# Altium footprint library Semicon-Discrete.pcblib: 205 footprints (part 12 of 13)
Each footprint in its own frame and in the unit in brackets; x right, y up, seen from the top. Pads: shape width x height; smd on the part's side, far side on the other; paste and mask are expansions set on the pad; w line width, h text height; cw(c..) or ccw(c..) is an arc to the next point about the centre after c.
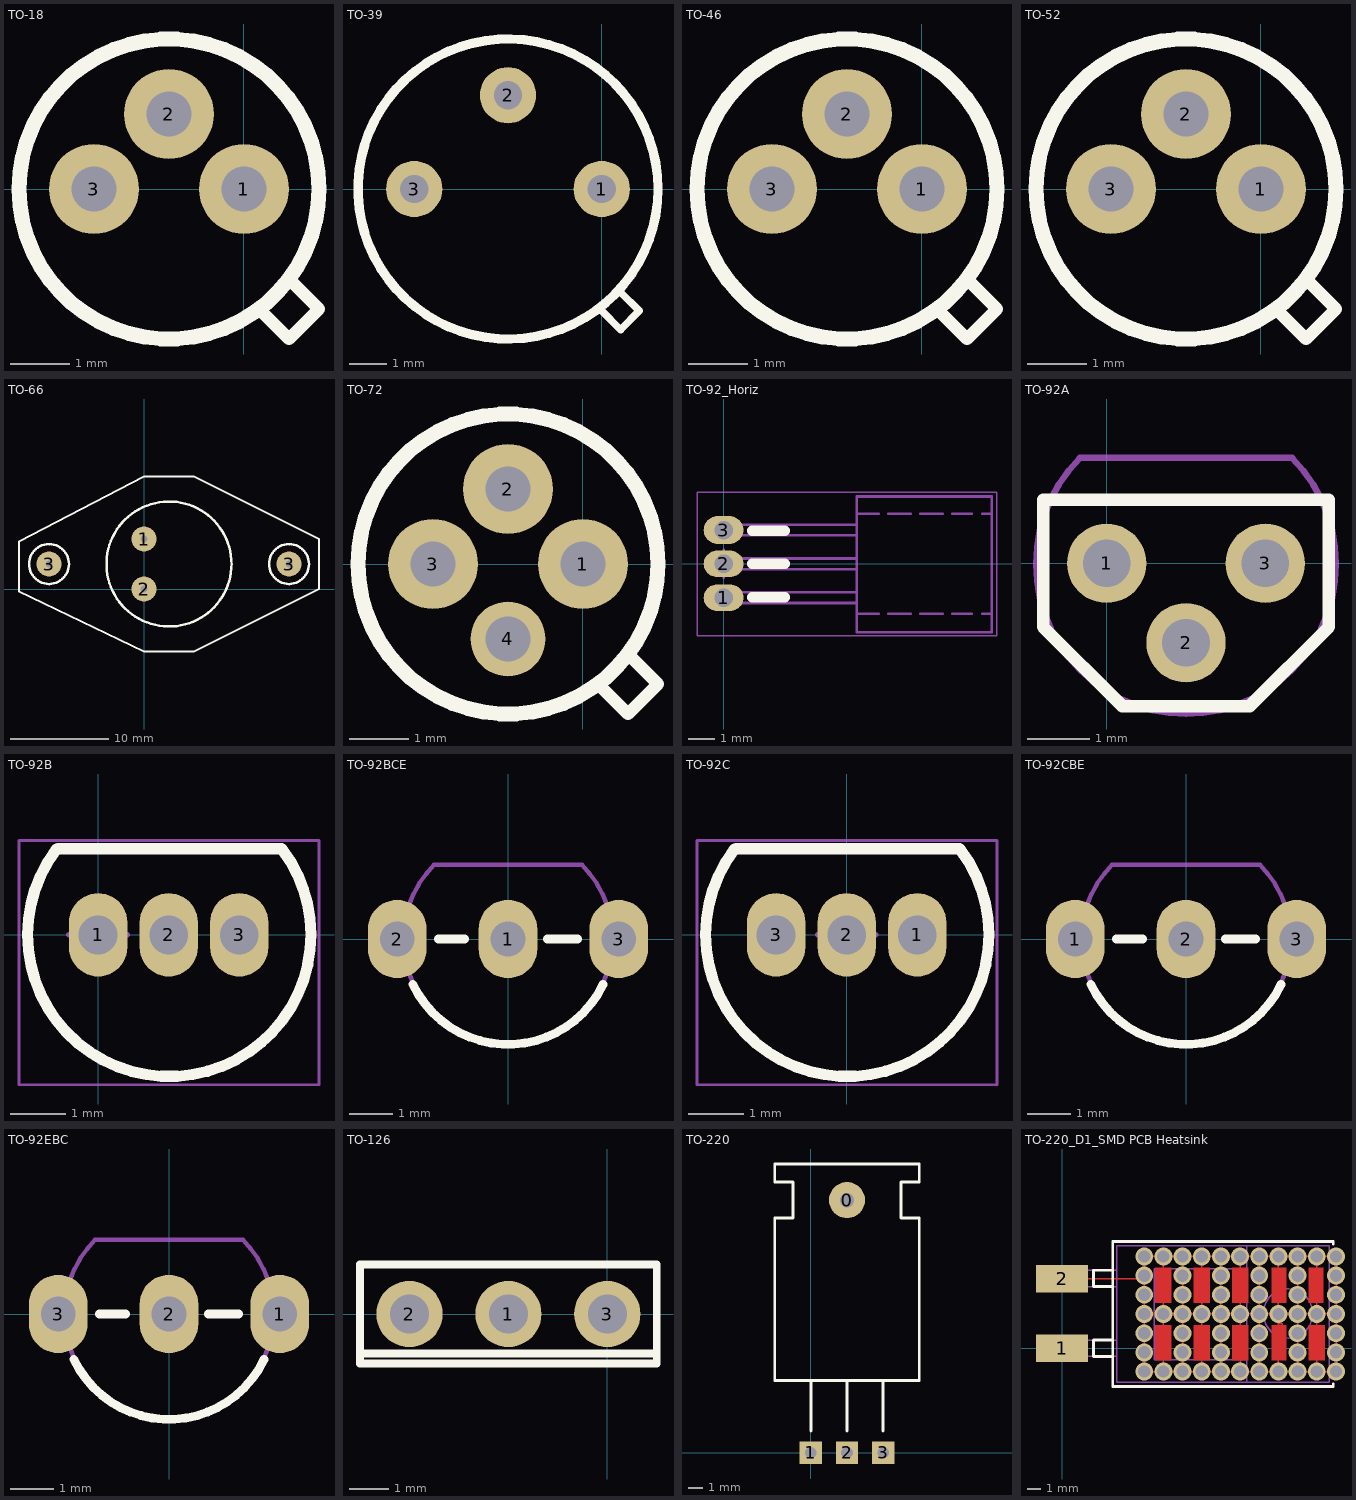
[diagram p11: the footprints below, top view; thin cyan lines are the x and y axes]

## TO-18 [mil]
pads (3):
  round 60 hole 30: 1(0,0) 2(-50,50) 3(-100,0)
TopOverlay:
  circle w10: c-50,0 r100
  lines w8: 10,-80 30,-100 50,-80 30,-60
4-TopCourty:
  lines w3.94: -20.67,0 20.67,0 ; 0,-20.67 0,20.67
7-TopAssy:
  text ".Designator" at -110.24,-34.45 h86.61

## TO-39 [mil]
pads (3):
  round 60 hole 30: 1(0,0) 2(-100,100) 3(-200,0)
TopOverlay:
  circle w10: c-100,0 r160
  lines w8: 0,-130 20,-150 40,-130 20,-110
4-TopCourty:
  lines w3.94: -20.67,0 20.67,0 ; 0,-20.67 0,20.67
7-TopAssy:
  text ".Designator" at -187.99,-69.88 h86.61

## TO-46 [mil]
pads (3):
  round 60 hole 30: 1(0,0) 2(-50,50) 3(-100,0)
TopOverlay:
  circle w10: c-50,0 r100
  lines w8: 10,-80 30,-100 50,-80 30,-60
4-TopCourty:
  lines w3.94: -20.67,0 20.67,0 ; 0,-20.67 0,20.67
7-TopAssy:
  text ".Designator" at -97.44,-71.85 h86.61

## TO-52 [mil]
pads (3):
  round 60 hole 30: 1(0,0) 2(-50,50) 3(-100,0)
TopOverlay:
  circle w10: c-50,0 r100
  lines w8: 10,-80 30,-100 50,-80 30,-60
4-TopCourty:
  lines w3.94: -20.67,0 20.67,0 ; 0,-20.67 0,20.67
7-TopAssy:
  text ".Designator" at -116.14,-61.02 h86.61

## TO-66 [mil]
pads (4):
  round 100 hole 28: 1(0,200) 2(0,0) 3(-380,100) 3(580,100)
TopOverlay:
  circle w10: c580,100 r80
  circle w10: c-380,100 r80
  circle w10: c100,100 r250
  lines w7.87: -500,-10 0,-250 200,-250 700,0 700,200 200,450 0,450 -500,190 -500,-10
4-TopCourty:
  lines w3.94: -20.67,0 20.67,0 ; 0,-20.67 0,20.67
7-TopAssy:
  text ".Designator" at -68.9,82.68 h86.61

## TO-72 [mil]
pads (4):
  round 60 hole 30: 1(0,0) 2(-50,50) 3(-100,0)
  round 50 hole 30: 4(-50,-50)
TopOverlay:
  circle w10: c-50,0 r100
  lines w8: 10,-80 30,-100 50,-80 30,-60
4-TopCourty:
  lines w3.94: -20.67,0 20.67,0 ; 0,-20.67 0,20.67
7-TopAssy:
  text ".Designator" at -109.25,-27.56 h86.61

## TO-92_Horiz [mm]
height 4
pads (3):
  oval 1.5x1 hole 0.7: 1(0,-1.27) 2(0,0)
  oval 1.5x1.05 hole 0.7: 3(0,1.27)
TopOverlay:
  lines w0.4: 1.075,-1.25 2.3,-1.25 ; 1.075,0 2.3,0 ; 1.075,1.25 2.3,1.25
2-TopCompOutl:
  lines w0.1: 5,-1.875 5.825,-1.875 ; 5,1.88 5.825,1.88 ; 6.2,-1.875 7.025,-1.875 ; 6.2,1.88 7.025,1.88 ; 7.4,-1.875 8.225,-1.875 ; 7.4,1.88 8.225,1.88 ; 8.6,-1.875 9.325,-1.875 ; 8.6,1.88 9.325,1.88 ; 9.725,-1.875 10.075,-1.875 ; 9.725,1.88 10.075,1.88 ; -0.125,-1.47 5,-1.47 ; -0.125,-1.47 -0.125,-1.07 ; -0.125,-1.47 -0.125,-1.07 ; -0.125,-1.07 5,-1.07 ; -0.1,-0.2 -0.1,0.2 ; -0.1,-0.2 5,-0.2 ; -0.1,-0.2 -0.1,0.2 ; -0.1,0.2 5,0.2 ; -0.1,1.07 5,1.07 ; -0.1,1.07 -0.1,1.47 ; -0.1,1.07 -0.1,1.47 ; -0.1,1.47 5,1.47 ; 5,-1.47 5,-1.07 ; 5,-1.47 5,-1.07 ; 5,-0.2 5,0.2 ; 5,-0.2 5,0.2 ; 5,1.07 5,1.47 ; 5,1.07 5,1.47 ; 5,-2.57 5,2.53 10.075,2.53 10.075,-2.57 5,-2.57
4-TopCourty:
  circle w0.1: c0,0 r0.35
  lines w0.05: -1,-2.705 -1,2.695 10.275,2.695 10.275,-2.705 -1,-2.705
  lines w0.1: -0.525,0 0.525,0 ; 0,-0.525 0,0.525 0,-0.525
7-TopAssy:
  lines w0.1: 5,-1.875 5.825,-1.875 ; 5,1.88 5.825,1.88 ; 6.2,-1.875 7.025,-1.875 ; 6.2,1.88 7.025,1.88 ; 7.4,-1.875 8.225,-1.875 ; 7.4,1.88 8.225,1.88 ; 8.6,-1.875 9.325,-1.875 ; 8.6,1.88 9.325,1.88 ; 9.725,-1.875 10.075,-1.875 ; 9.725,1.88 10.075,1.88 ; -0.125,-1.47 -0.125,-1.07 ; -0.125,-1.47 -0.125,-1.07 ; -0.125,-1.47 5,-1.47 ; -0.125,-1.07 5,-1.07 ; -0.1,-0.2 -0.1,0.2 ; -0.1,-0.2 5,-0.2 ; -0.1,-0.2 -0.1,0.2 ; -0.1,0.2 5,0.2 ; -0.1,1.07 -0.1,1.47 ; -0.1,1.07 -0.1,1.47 ; -0.1,1.07 5,1.07 ; -0.1,1.47 5,1.47 ; 5,-1.47 5,-1.07 ; 5,-1.47 5,-1.07 ; 5,-0.2 5,0.2 ; 5,-0.2 5,0.2 ; 5,1.07 5,1.47 ; 5,1.07 5,1.47 ; 5,-2.57 10.075,-2.57 10.075,2.53 5,2.53 5,-2.57
  text ".Designator" at -2.55,2.25 h2.2
3D body "TO92_Horizontal.STEP": height 2.75, standoff -2.7, extent -0.225,-2.525 9.776,2.532

## TO-92A [mil]
pads (3):
  round 50 hole 30: 1(0,0) 2(50,-50) 3(100,0)
TopOverlay:
  lines w8: -40,-40 -40,40 140,40 140,-40 90,-90 10,-90 -40,-40
4-TopCourty:
  circle w3.94: c0,0 r13.78
  lines w3.94: -20.67,0 20.67,0 ; 0,-20.67 0,20.67
7-TopAssy:
  lines w3.94: -16.93,66.54 116.93,66.54 ; -16.81,66.42 ccw(c50,-0.39) 116.81,66.42
  text ".Designator" at -11.02,-29.92 h86.61

## TO-92B [mm]
pads (3):
  oval 1.05x1.5 hole 0.7: 1(0,0) 2(1.27,0) 3(2.54,0)
TopOverlay:
  lines w0.2: -0.747,1.548 ccw(c1.28,0) 3.303,1.552 ; -0.725,1.55 3.3,1.55
2-TopCompOutl:
  lines w0.1: -0.747,1.548 ccw(c1.28,0) 3.303,1.552 ; -0.725,1.55 3.3,1.55
4-TopCourty:
  circle w0.1: c0,0 r0.35
  lines w0.05: -1.425,-2.7 -1.425,1.7 3.975,1.7 3.975,-2.7 -1.425,-2.7
  lines w0.1: -0.525,0 0.525,0 ; 0,-0.525 0,0.525
7-TopAssy:
  lines w0.1: -0.747,1.548 ccw(c1.28,0) 3.303,1.552 ; -0.725,1.55 3.3,1.55
  text ".Designator" at -0.13,-0.75 h2.2

## TO-92BCE [mm]
pads (3):
  oval 1.35x1.8 hole 0.8: 1(0,0) 2(-2.54,0) 3(2.54,0)
TopOverlay:
  lines w0.2: -2.182,-1.039 ccw(c0,0) 2.18,-1.043 ; -1.6,0 -1,0 ; 0.9,0 1.6,0
2-TopCompOutl:
  lines w0.1: -1.7,1.7 1.7,1.7 ; -1.697,1.697 ccw(c0,0) 1.697,1.697
4-TopCourty:
  circle w0.1: c0,0 r0.35
  lines w0.1: -0.525,0 0.525,0 ; 0,-0.525 0,0.525
7-TopAssy:
  lines w0.1: -1.7,1.7 1.7,1.7 ; -1.697,1.697 ccw(c0,0) 1.697,1.697
  text ".Designator" at -2.1,1.975 h2.2

## TO-92C [mm]
height 6.7
pads (3):
  oval 1.05x1.5 hole 0.7: 1(1.27,0) 2(0,0) 3(-1.27,0)
TopOverlay:
  lines w0.2: -2.017,1.548 ccw(c0.01,0) 2.033,1.552 ; -1.995,1.55 2.03,1.55
2-TopCompOutl:
  lines w0.1: -2.017,1.548 ccw(c0.01,0) 2.033,1.552 ; -1.995,1.55 2.03,1.55
4-TopCourty:
  circle w0.1: c0,0 r0.35
  lines w0.05: -2.695,-2.7 2.705,-2.7 2.705,1.7 -2.695,1.7 -2.695,-2.7
  lines w0.1: -0.525,0 0.525,0 ; 0,-0.525 0,0.525
7-TopAssy:
  lines w0.1: -2.017,1.548 ccw(c0.01,0) 2.033,1.552 ; -1.995,1.55 2.03,1.55
  text ".Designator" at -1.4,-0.75 h2.2
3D body "TO92C.STEP": height 6.7, standoff -2.6, extent -2.525,-2.525 2.532,1.553

## TO-92CBE [mm]
height 5
pads (3):
  oval 1.35x1.8 hole 0.8: 1(-2.54,0) 2(0,0) 3(2.54,0)
TopOverlay:
  lines w0.2: -2.182,-1.039 ccw(c0,0) 2.18,-1.043 ; -1.6,0 -1,0 ; 0.9,0 1.6,0
2-TopCompOutl:
  lines w0.1: -1.7,1.7 1.7,1.7 ; -1.697,1.697 ccw(c0,0) 1.697,1.697
4-TopCourty:
  lines w0.1: -0.525,0 0.525,0 ; 0,-0.525 0,0.525
7-TopAssy:
  lines w0.1: -1.7,1.7 1.7,1.7 ; -1.697,1.697 ccw(c0,0) 1.697,1.697
  text ".Designator" at -1.18,-0.69 h2.2

## TO-92EBC [mm]
pads (3):
  oval 1.35x1.8 hole 0.8: 1(2.54,0) 2(0,0) 3(-2.54,0)
TopOverlay:
  lines w0.2: -2.182,-1.039 ccw(c0,0) 2.18,-1.043 ; -1.6,0 -1,0 ; 0.9,0 1.6,0
2-TopCompOutl:
  lines w0.1: -1.7,1.7 1.7,1.7 ; -1.697,1.697 ccw(c0,0) 1.697,1.697
4-TopCourty:
  circle w0.1: c0,0 r0.35
  lines w0.1: -0.525,0 0.525,0 ; 0,-0.525 0,0.525
7-TopAssy:
  lines w0.1: -1.7,1.7 1.7,1.7 ; -1.697,1.697 ccw(c0,0) 1.697,1.697
  text ".Designator" at -1.41,-0.73 h2.2

## TO-126 [mm]
pads (3):
  round 1.7 hole 1: 1(-2.54,0) 2(-5.08,0) 3(0,0)
TopOverlay:
  lines w0.2: -6.35,-1.016 1.27,-1.016 ; -6.35,-1.27 -6.35,1.27 1.27,1.27 1.27,-1.27 -6.35,-1.27
2-TopCompOutl:
  lines w0.1: -6.4,-1.3 -6.4,1.3 1.3,1.3 1.3,-1.3 -6.4,-1.3
4-TopCourty:
  lines w0.1: -0.525,0 0.525,0 ; 0,-0.525 0,0.525
7-TopAssy:
  text ".Designator" at -5.35,1.575 h2.2

## TO-220 [mil]
pads (4):
  round 100 hole 40: 0(100,700)
  rect 62x62 hole 32: 1(0,0) 2(100,0) 3(200,0)
TopOverlay:
  lines w7.87: 0,60 0,200 ; 100,60 100,200 ; 200,60 200,200 ; -100,200 -100,650 -50,650 -50,750 -100,750 -100,800 300,800 300,750 250,750 250,650 300,650 300,200 -100,200
4-TopCourty:
  lines w3.94: -20.67,0 20.67,0 ; 0,-20.67 0,20.67
7-TopAssy:
  text ".Designator" at 0.98,431.1 h86.61

## TO-220_D1_SMD PCB Heatsink [mm]
height 4.5
pads (2):
  rect 3.8x2 smd: 1(0,0) 2(0,5.075)
via 20,-0.3 diameter 1.3 hole 0.9
via 20,1.1 diameter 1.3 hole 0.9
via 20,-1.7 diameter 1.3 hole 0.9
via 18.6,-1.7 diameter 1.3 hole 0.9
via 15.8,-1.7 diameter 1.3 hole 0.9
via 17.2,-1.7 diameter 1.3 hole 0.9
via 17.2,-0.3 diameter 1.3 hole 0.9
via 17.2,1.1 diameter 1.3 hole 0.9
via 14.4,1.1 diameter 1.3 hole 0.9
via 14.4,-0.3 diameter 1.3 hole 0.9
via 14.4,-1.7 diameter 1.3 hole 0.9
via 13,-1.7 diameter 1.3 hole 0.9
via 11.6,1.1 diameter 1.3 hole 0.9
via 11.6,-0.3 diameter 1.3 hole 0.9
via 11.6,-1.7 diameter 1.3 hole 0.9
via 10.2,-1.7 diameter 1.3 hole 0.9
via 7.4,-1.7 diameter 1.3 hole 0.9
via 8.8,-1.7 diameter 1.3 hole 0.9
via 8.8,-0.3 diameter 1.3 hole 0.9
via 8.8,1.1 diameter 1.3 hole 0.9
via 6,-1.7 diameter 1.3 hole 0.9
via 6,-0.3 diameter 1.3 hole 0.9
via 6,1.1 diameter 1.3 hole 0.9
via 20,5.3 diameter 1.3 hole 0.9
via 20,3.9 diameter 1.3 hole 0.9
via 20,2.5 diameter 1.3 hole 0.9
via 20,6.7 diameter 1.3 hole 0.9
via 18.6,6.7 diameter 1.3 hole 0.9
via 15.8,6.7 diameter 1.3 hole 0.9
via 17.2,6.7 diameter 1.3 hole 0.9
via 17.2,5.3 diameter 1.3 hole 0.9
via 17.2,3.9 diameter 1.3 hole 0.9
via 18.6,2.5 diameter 1.3 hole 0.9
via 17.2,2.5 diameter 1.3 hole 0.9
via 14.4,3.9 diameter 1.3 hole 0.9
via 14.4,5.3 diameter 1.3 hole 0.9
via 14.4,6.7 diameter 1.3 hole 0.9
via 13,6.7 diameter 1.3 hole 0.9
via 11.6,3.9 diameter 1.3 hole 0.9
via 11.6,5.3 diameter 1.3 hole 0.9
via 11.6,6.7 diameter 1.3 hole 0.9
via 10.2,6.7 diameter 1.3 hole 0.9
via 7.4,6.7 diameter 1.3 hole 0.9
via 8.8,6.7 diameter 1.3 hole 0.9
via 8.8,5.3 diameter 1.3 hole 0.9
via 8.8,3.9 diameter 1.3 hole 0.9
via 15.8,2.5 diameter 1.3 hole 0.9
via 14.4,2.5 diameter 1.3 hole 0.9
via 13,2.5 diameter 1.3 hole 0.9
via 11.6,2.5 diameter 1.3 hole 0.9
via 10.2,2.5 diameter 1.3 hole 0.9
via 8.8,2.5 diameter 1.3 hole 0.9
via 7.4,2.5 diameter 1.3 hole 0.9
via 6,6.7 diameter 1.3 hole 0.9
via 6,5.3 diameter 1.3 hole 0.9
via 6,3.9 diameter 1.3 hole 0.9
via 6,2.5 diameter 1.3 hole 0.9
TopLayer:
  region: 19.2,1.7 18,1.7 18,-0.9 19.2,-0.9
  region: 16.4,1.7 15.3,1.7 15.3,-0.9 16.4,-0.9
  region: 13.6,1.7 12.4,1.7 12.4,-0.9 13.6,-0.9
  region: 10.8,1.7 9.6,1.7 9.6,-0.9 10.8,-0.9
  region: 8,1.7 6.8,1.7 6.8,-0.9 8,-0.9
  region: 19.1,5.9 18,5.9 18,3.3 19.1,3.3
  region: 16.4,5.9 15.3,5.9 15.3,3.3 16.4,3.3
  region: 13.6,5.9 12.4,5.9 12.4,3.3 13.6,3.3
  region: 10.8,5.9 9.6,5.9 9.6,3.3 10.8,3.3
  region: 8,5.9 6.8,5.9 6.8,3.3 8,3.3
  lines w0.1: 0,5.075 5.45,5.075 6,5.3 6,6.7 20,6.7 20,-1.7 ; 6,2.5 20,2.5 ; 6,5.5 6,-1.7 ; 7.4,-1.7 7.4,6.7 ; 8.8,-1.7 8.8,6.7 ; 10.2,-1.7 10.2,6.7 ; 11.6,-1.7 11.6,6.7 ; 13,-1.7 13,6.7 ; 14.4,-1.7 14.4,6.7 ; 15.8,-1.7 15.8,6.7 ; 15.8,0.4 16.075,0.4 16.075,1.8 15.8,1.8 ; 15.8,3.25 15.8,3.85 16.175,3.85 16.175,4.6 15.8,4.6 15.8,4.625 ; 17.2,-1.7 17.2,6.7 ; 18.35,4.6 18.6,4.6 18.6,3.2 ; 18.6,-1.7 18.6,6.7 ; 18.6,0.4 18.6,1.8 ; 6,-1.7 20,-1.7 ; 6,-1.7 20,-1.7 ; 7.4,6.7 7.4,6.7 ; 7.4,6.7 7.4,6.7 ; 8.8,6.7 8.8,6.7 ; 11.6,6.7 11.6,6.7 ; 11.6,6.7 11.6,6.7 ; 13,6.7 13,6.7 ; 13,6.7 13,6.7 ; 14.4,6.7 14.4,6.7 ; 14.4,6.7 14.4,6.7
TopOverlay:
  lines w0.2: 3.7,-0.6 2.3,-0.6 2.3,0.6 3.7,0.6 ; 3.7,4.5 2.3,4.5 2.3,5.7 3.7,5.7 ; 19.8,-2.6 19.8,-2.8 3.7,-2.8 3.7,-0.9 3.7,5.9 3.7,7.8 19.8,7.8 19.8,7.6
TopPaste:
  region: 8,5.9 6.8,5.9 6.8,3.3 8,3.3
  region: 10.8,5.9 9.6,5.9 9.6,3.3 10.8,3.3
  region: 13.6,5.9 12.4,5.9 12.4,3.3 13.6,3.3
  region: 16.4,5.9 15.3,5.9 15.3,3.3 16.4,3.3
  region: 19.1,5.9 18,5.9 18,3.3 19.1,3.3
  region: 8,1.7 6.8,1.7 6.8,-0.9 8,-0.9
  region: 10.8,1.7 9.6,1.7 9.6,-0.9 10.8,-0.9
  region: 13.6,1.7 12.4,1.7 12.4,-0.9 13.6,-0.9
  region: 16.4,1.7 15.3,1.7 15.3,-0.9 16.4,-0.9
  region: 19.2,1.7 18,1.7 18,-0.9 19.2,-0.9
TopSolder:
  region: 8.05,5.95 6.75,5.95 6.75,3.25 8.05,3.25
  region: 10.85,5.95 9.55,5.95 9.55,3.25 10.85,3.25
  region: 13.65,5.95 12.35,5.95 12.35,3.25 13.65,3.25
  region: 16.45,5.95 15.25,5.95 15.25,3.25 16.45,3.25
  region: 19.15,5.95 17.95,5.95 17.95,3.25 19.15,3.25
  region: 8.05,1.75 6.75,1.75 6.75,-0.95 8.05,-0.95
  region: 10.85,1.8 9.55,1.8 9.55,-0.95 10.85,-0.95
  region: 13.65,1.75 12.35,1.75 12.35,-0.95 13.65,-0.95
  region: 16.45,1.75 15.25,1.75 15.25,-0.95 16.45,-0.95
  region: 19.25,1.75 17.95,1.75 17.95,-0.95 19.25,-0.95
2-TopCompOutl:
  circle w0.1: c16.5,2.54 r1.8
  lines w0.1: 4,-0.6 1.4,-0.6 1.4,-0.4 0,-0.4 0,0.4 1.4,0.4 1.4,0.6 4,0.6 ; 4,4.48 1.4,4.48 1.4,4.68 0,4.68 0,5.48 1.4,5.48 1.4,5.68 4,5.68 ; 13.5,-2.5 13.5,7.5 ; 4,-2.5 4,7.5 19.5,7.5 19.5,-2.5 4,-2.5
4-TopCourty:
  lines w0.1: -0.525,0 0.525,0 ; 0,-0.525 0,0.525
5-MCadOutl:
  lines w0.1: 13.5,-2.45 13.5,-0.85 6.75,-0.85 6.75,5.8 13.5,5.8 13.5,7.5
7-TopAssy:
  text ".Designator" at 4.825,1.7 h2.2